# Altium footprint library BBC_Footprints.PcbLib: 171 footprints (part 1 of 11)
Each footprint in its own frame and in the unit in brackets; x right, y up, seen from the top. Pads: shape width x height; smd on the part's side, far side on the other; paste and mask are expansions set on the pad; w line width, h text height; cw(c..) or ccw(c..) is an arc to the next point about the centre after c.
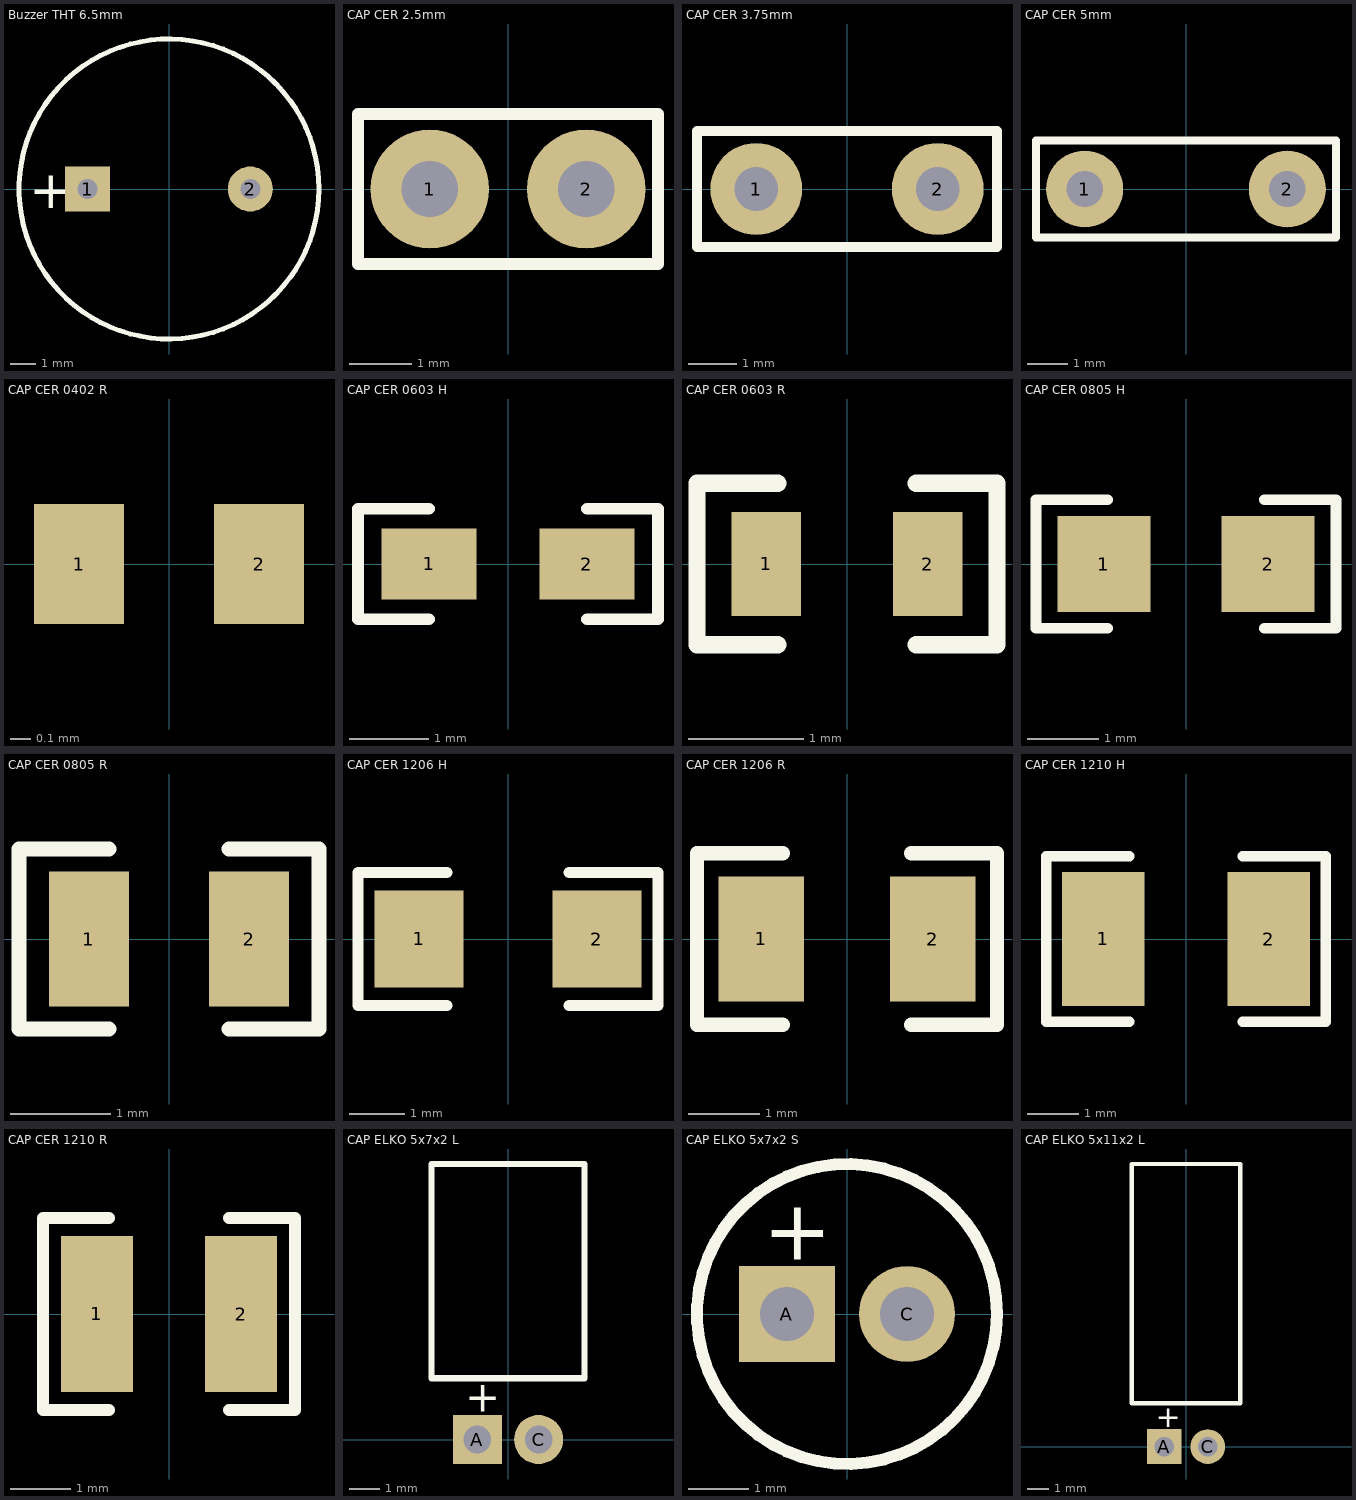
[diagram p0: the footprints below, top view; thin cyan lines are the x and y axes]

## Buzzer THT 6.5mm [mm] "piezo buzzer / tht mount / 3.5mm pitch"
pads (2):
  rect 1.8x1.8 hole 0.8: 1(-3.25,0)
  round 1.8 hole 0.8: 2(3.25,0)
Top Overlay:
  circle w0.2: c0,0 r6
  text "+" at -5.6,-0.774 h1.52
3D body "ABT410.step": height 8.5, standoff -5, extent -6,-6 6,6

## CAP CER 2.5mm [mm] "ceramic capacitor for tht mount with a 2.5mm pitch"
height 10
pads (2):
  round 1.9 hole 0.9: 1(-1.25,0) 2(1.25,0)
Top Overlay:
  lines w0.2: -2.4,-1.2 2.4,-1.2 2.4,1.2 -2.4,1.2 -2.4,-1.2
3D body "User Library-Cer-Cap2 (3_5x1_5).step": height 4.5, standoff -2, extent -1.854,-1.042 1.854,1.043

## CAP CER 3.75mm [mm] "ceramic capacitor for tht mount with a 3.75mm pitch"
height 10
pads (2):
  round 1.9 hole 0.9: 1(-1.875,0) 2(1.875,0)
Top Overlay:
  lines w0.2: -3.1,-1.2 -3.1,1.2 3.1,1.2 3.1,-1.2 -3.1,-1.2
3D body "User Library-Ceramic Capacitor 5x3_75mm.step": height 6.96, standoff -2, extent -2.458,-1 2.459,1

## CAP CER 5mm [mm] "ceramic capacitor for tht mount with a 5mm pitch"
height 10
pads (2):
  round 1.9 hole 0.9: 1(-2.5,0) 2(2.5,0)
Top Overlay:
  lines w0.2: -3.7,-1.2 -3.7,1.2 3.7,1.2 3.7,-1.2 -3.7,-1.2
3D body "User Library-Cer-Cap2_5 (5x1_5).step": height 6, standoff -2, extent -2.915,-1.678 2.915,1.679

## CAP CER 0402 R [mm] "0402 ceramic capacitor for reflow soldering"
pads (2):
  rect 0.45x0.6 smd: 1(-0.45,0) 2(0.45,0)
3D body "CAP 0402.step": height 0.5, standoff 0, extent -0.5,-0.25 0.5,0.25

## CAP CER 0603 H [mm] "0603 ceramic capacitor for hand soldering"
pads (2):
  rect 1.2x0.9 smd: 1(-1,0) 2(1,0)
Top Overlay:
  lines w0.15: -1,-0.7 -1.9,-0.7 -1.9,0.7 -1,0.7 ; 1,-0.7 1.9,-0.7 1.9,0.7 1,0.7
3D body "CAP 0603.step": height 0.5, standoff 0, extent -0.8,-0.4 0.8,0.4

## CAP CER 0603 R [mm] "0603 ceramic capacitor for reflow soldering"
pads (2):
  rect 0.6x0.9 smd: 1(-0.7,0) 2(0.7,0)
Top Overlay:
  lines w0.15: -0.6,-0.7 -1.3,-0.7 -1.3,0.7 -0.6,0.7 ; 0.6,-0.7 1.3,-0.7 1.3,0.7 0.6,0.7
3D body "CAP 0603.step": height 0.5, standoff 0, extent -0.8,-0.4 0.8,0.4

## CAP CER 0805 H [mm] "0805 ceramic capacitor for hand soldering"
pads (2):
  rect 1.3x1.35 smd: 1(-1.15,0) 2(1.15,0)
Top Overlay:
  lines w0.15: -1.1,-0.9 -2.1,-0.9 -2.1,0.9 -1.1,0.9 ; 1.1,-0.9 2.1,-0.9 2.1,0.9 1.1,0.9
3D body "CAP 0805.step": height 0.8, standoff 0, extent -1,-0.625 1,0.625

## CAP CER 0805 R [mm] "0805 ceramic capacitor for reflow soldering"
pads (2):
  rect 0.8x1.35 smd: 1(-0.8,0) 2(0.8,0)
Top Overlay:
  lines w0.15: -0.6,-0.9 -1.5,-0.9 -1.5,0.9 -0.6,0.9 ; 0.6,-0.9 1.5,-0.9 1.5,0.9 0.6,0.9
3D body "CAP 0805.step": height 0.8, standoff 0, extent -1,-0.625 1,0.625

## CAP CER 1206 H [mm] "1206 ceramic capacitor for hand soldering"
pads (2):
  rect 1.6x1.75 smd: 1(-1.6,0) 2(1.6,0)
Top Overlay:
  lines w0.2: -1.1,-1.2 -2.7,-1.2 -2.7,1.2 -1.1,1.2 ; 1.1,-1.2 2.7,-1.2 2.7,1.2 1.1,1.2
3D body "CAP 1206.step": height 1.15, standoff 0, extent -1.6,-0.8 1.6,0.8

## CAP CER 1206 R [mm] "1206 ceramic capacitor for reflow soldering"
pads (2):
  rect 1.2x1.75 smd: 1(-1.2,0) 2(1.2,0)
Top Overlay:
  lines w0.2: -0.9,-1.2 -2.1,-1.2 -2.1,1.2 -0.9,1.2 ; 0.9,-1.2 2.1,-1.2 2.1,1.2 0.9,1.2
3D body "CAP 1206.step": height 1.15, standoff 0, extent -1.6,-0.8 1.6,0.8

## CAP CER 1210 H [mm] "1210 ceramic capacitor for hand soldering"
pads (2):
  rect 1.6x2.6 smd: 1(-1.6,0) 2(1.6,0)
Top Overlay:
  lines w0.2: -1.1,-1.6 -2.7,-1.6 -2.7,1.6 -1.1,1.6 ; 1.1,-1.6 2.7,-1.6 2.7,1.6 1.1,1.6
3D body "CAP 1210.step": height 0.95, standoff 0, extent -1.6,-1.25 1.6,1.25

## CAP CER 1210 R [mm] "1210 ceramic capacitor for reflow soldering"
pads (2):
  rect 1.2x2.6 smd: 1(-1.2,0) 2(1.2,0)
Top Overlay:
  lines w0.2: -1,-1.6 -2.1,-1.6 -2.1,1.6 -1,1.6 ; 1,-1.6 2.1,-1.6 2.1,1.6 1,1.6
3D body "CAP 1210.step": height 0.95, standoff 0, extent -1.6,-1.25 1.6,1.25

## CAP ELKO 5x7x2 L [mm] "aluminium electrolytic capacitor lying on the pcb / d=5, h=7, pitch = 2"
height 5
pads (2):
  rect 1.6x1.6 hole 0.9: A(-1,0)
  round 1.6 hole 0.9: C(1,0)
Top Overlay:
  lines w0.2: -2.5,2 2.5,2 2.5,9 -2.5,9 -2.5,2
  text "+" at -1.4,0.9 h1
3D body "CAP ELKO 5x7x2 L.step": height 5.03, standoff -3.5, extent -2.525,-0.295 2.525,9.025

## CAP ELKO 5x7x2 S [mm] "aluminium electrolytic capacitor standing upright on the pcb / d=5, h=7, pitch = 2"
height 7
pads (2):
  rect 1.6x1.6 hole 0.9: A(-1,0)
  round 1.6 hole 0.9: C(1,0)
Top Overlay:
  circle w0.2: c0,0 r2.5
  text "+" at -1.4,0.9 h1
3D body "CAP ELKO 5x7x2 S.step": height 7.53, standoff -3.27, extent -2.525,-2.525 2.526,2.525

## CAP ELKO 5x11x2 L [mm] "aluminium electrolytic capacitor lying on the pcb / d=5, h=11, pitch = 2"
height 5
pads (2):
  rect 1.6x1.6 hole 0.9: A(-1,0)
  round 1.6 hole 0.9: C(1,0)
Top Overlay:
  lines w0.2: -2.5,2 2.5,2 2.5,13 -2.5,13 -2.5,2
  text "+" at -1.4,0.9 h1
3D body "CAP ELKO 5x11x2 L.step": height 5.03, standoff -3.5, extent -2.525,-0.295 2.525,13.026